# Altium schematic symbol library Electronic Devices_LIB.SchLib: 703 symbols (part 6 of 8) (continued)
## IND_4.7uH_1.01A_1210_CBC3225T4R7MR
designator L?, comment Case Code (Imperial): 1210  Max DC Current: 1.01A  Inductance: 4.7uH  (hidden comment: CBC3225T4R7MR)
Inductor Power Chip Wirewound 4.7uH 20% 100KHz Ferrite 1.01A 0.13Ohm DCR 1210 T/R; Manufacturer: Taiyo Yuden; Self Resonant Frequency: 70MHz; Saturation Current: 1.25A; Shielding: Unshielded; Resistance: 0.1R; DC Resistance (DCR): 130mR; Supplier 1: Digikey; Manufacturer Part Number: CBC3225T4R7MR; RoHS: Yes; Category: Fixed Inductors; Stock 1: 865462; Pricing 1: 1=0.25, 10=0.192, 25=0.1732, 50=0.1606, 100=0.1488, 250=0.13456, 500=0.12468, 1000=0.11549, 2000=0.10696, 3000=0.10226, 5000=0.09661, 7000=0.09305, 10000=0.08942, 25000=0.08068, 50000=0.07625 (USD); Mount: Surface Mount; Case/Package: 1210; Number of Pins: 2; Core Material: Ferrite; Case Code (Metric): 3225; Min Operating Temperature: -40°C; Max Operating Temperature: 105°C; Tolerance: 20%; Packaging: Tape and Reel; Package Quantity: 1000; Termination: SMD/SMT; Test Frequency: 100kHz; Current Rating: 1.01A; Series: CB; Inductance Tolerance: 20%; DC Current: 1.01A; Inductor Type: POWER; RMS Current (Irms): 1.01A; Series Resistance: 130mR; Length: 0.126inch; Width: 0.098inch; Height: 2.5mm; Height - Seated (Max): 0.106inch; Depth: 2.7mm; Radiation Hardening: No; RoHS Compliant: Yes; Military Standard: Not; Lead Free: Lead Free; Halogen Free: Halogen Free; Reach SVHC Compliant: Unknown; ComponentLink1URL: https://datasheet.ciiva.com/8505/wound02-e-8505619.pdf?src-supplier=Avnet; ComponentLink1Description: https://datasheet.ciiva.com/8505/wound02-e-8505619.pdf?src-supplier=Avnet; ComponentLink2URL: https://datasheet.ciiva.com/15981/787cbc3225t4r7mr-15981712.pdf?src-supplier=Onlinecomponents.com; ComponentLink2Description: https://datasheet.ciiva.com/15981/787cbc3225t4r7mr-15981712.pdf?src-supplier=Onlinecomponents.com; ComponentLink3URL: https://datasheet.ciiva.com/26871/getdatasheetpartid-638538-26871185.pdf?src-supplier=Verical; ComponentLink3Description: https://datasheet.ciiva.com/26871/getdatasheetpartid-638538-26871185.pdf?src-supplier=Verical; ComponentLink4URL: https://datasheet.ciiva.com/7291/cbc3225t4r7mr-ss-7291523.pdf?src-supplier=Newark; ComponentLink4Description: https://datasheet.ciiva.com/7291/cbc3225t4r7mr-ss-7291523.pdf?src-supplier=Newark; ComponentLink5URL: https://datasheet.ciiva.com/8001/1521599-8001884.pdf?src-supplier=Element14; ComponentLink5Description: https://datasheet.ciiva.com/8001/1521599-8001884.pdf?src-supplier=Element14; Supplier Part Number 1: 587-1624-1-ND
footprint IND_1210_NDC3225X270N
pins: 1, 2

## IND_4.7uH_2.9A_74438356047
designator L?, comment 74438356047  Current Rating: 2.9A  Inductance: 4.7uH
WE-MAPI; Shielded Wire-wound SMD Inductor with Magnetic Iron Alloy Core; 4.7 µH; Manufacturer: Wurth Electronics; Core Material: Metal,Composite; DC Resistance (DCR): 76mR; Self Resonant Frequency: 22MHz; Test Frequency: 100kHz; Tolerance: 20%; Saturation Current: 4.7A; Supplier 1: Digi-Key; Manufacturer Part Number: 74438356047; RoHS: Yes; Category: Fixed Inductors; Stock 1: 1624; Pricing 1: 1=1.94, 10=1.898, 50=1.815, 100=1.672, 500=1.541 (USD); Mount: Surface Mount; Case/Package: SMD/SMT; Number of Pins: 2; Min Operating Temperature: -40°C; Max Operating Temperature: 125°C; Shielding: Shielded; Series: WE-MAPI; Packaging: Cut Tape; Length: 0.161inch; Width: 0.161inch; Height - Seated (Max): 0.083inch; RoHS Compliant: Yes; ComponentLink1URL: http://www.farnell.com/datasheets/2618709.pdf?src-supplier=Farnell; ComponentLink1Description: http://www.farnell.com/datasheets/2618709.pdf?src-supplier=Farnell; ComponentLink2URL: http://www.farnell.com/datasheets/2618709.pdf?src-supplier=Element14; ComponentLink2Description: http://www.farnell.com/datasheets/2618709.pdf?src-supplier=Element14; ComponentLink3URL: http://www.farnell.com/datasheets/2618709.pdf?src-supplier=Newark; ComponentLink3Description: http://www.farnell.com/datasheets/2618709.pdf?src-supplier=Newark; ComponentLink4URL: https://katalog.we-online.de/pbs/datasheet/74438356047.pdf?src-supplier=Digi-Key; ComponentLink4Description: https://katalog.we-online.de/pbs/datasheet/74438356047.pdf?src-supplier=Digi-Key; Supplier Part Number 1: 732-8234-1-ND
footprint IND_74438356047 (0.161" L x 0.161" W (4.10mm x 4.10mm))
pins: 1, 2

## IND_4.7uH_5.8A_SMD
designator L?, comment SRN8040TA-4R7M  Inductance: 4.7uH  RMS Current (Irms): 5.8A
Inductor Power Semi-Shielded Wirewound 4.7uH 20% 1MHz 15Q-Factor Ferrite 5.8A 0.0195Ohm DCR 3131 Automotive T/R; Manufacturer: Bourns; Saturation Current: 6.7A; DC Resistance (DCR): 19.5mR; Self Resonant Frequency: 38MHz; Supplier 1: Digi-Key; Manufacturer Part Number: SRN8040TA-4R7M; RoHS: Yes; Category: Fixed Inductors; Stock 1: 51554; Pricing 1: 1=0.73, 10=0.674, 25=0.5704, 50=0.5186, 100=0.4875, 250=0.43564, 500=0.37342 (USD); Mount: Surface Mount; Case/Package: Nonstandard; Core Material: Ferrite; Min Operating Temperature: -55°C; Max Operating Temperature: 125°C; Packaging: Cut Tape; Inductance Tolerance: 20%; Series: SRN8040TA; Tolerance: 20%; Shielding: Shielded; Test Frequency: 1MHz; Ratings: AEC-Q200; Reach SVHC Compliant: No; RoHS Compliant: Yes; ComponentLink1URL: http://www.farnell.com/datasheets/2647424.pdf?src-supplier=Farnell; ComponentLink1Description: http://www.farnell.com/datasheets/2647424.pdf?src-supplier=Farnell; ComponentLink2URL: https://www.bourns.com/docs/Product-Datasheets/SRN8040TA.pdf?src-supplier=Digi-Key; ComponentLink2Description: https://www.bourns.com/docs/Product-Datasheets/SRN8040TA.pdf?src-supplier=Digi-Key; ComponentLink3URL: http://www.farnell.com/datasheets/2113224.pdf?src-supplier=Element14; ComponentLink3Description: http://www.farnell.com/datasheets/2113224.pdf?src-supplier=Element14; ComponentLink4URL: http://www.farnell.com/datasheets/2647424.pdf?src-supplier=Newark; ComponentLink4Description: http://www.farnell.com/datasheets/2647424.pdf?src-supplier=Newark; ComponentLink5URL: https://datasheet.octopart.com/SRN8040TA-4R7M-Bourns-datasheet-66075752.pdf?src-supplier=Newark; ComponentLink5Description: https://datasheet.octopart.com/SRN8040TA-4R7M-Bourns-datasheet-66075752.pdf?src-supplier=Newark; ComponentLink6URL: https://datasheet.octopart.com/SRN8040TA-4R7M-Bourns-datasheet-154729938.pdf?src-supplier=Electro+Sonic; ComponentLink6Description: https://datasheet.octopart.com/SRN8040TA-4R7M-Bourns-datasheet-154729938.pdf?src-supplier=Electro+Sonic; Supplier Part Number 1: SRN8040TA-4R7MCT-ND
footprint IND_INDPM8080X450N (0.315" L x 0.315" W (8.00mm x 8.00mm))
pins: 1, 2

## IND_6.8uH_870mA_XPL2010-682MLC
designator L?, comment Max DC Current: 870mA  Inductance: 6.8uH  (hidden comment: XPL2010-682MLC)
Power inductor, shielded, 20% tol, SMT, RoHS; Manufacturer: Coilcraft; Core Material: Composite; Self Resonant Frequency: 33MHz; Test Frequency: 100kHz; Supplier 1: Mouser; Manufacturer Part Number: XPL2010-682MLC; RoHS: Yes; Category: Fixed Inductors; Stock 1: 16811; Pricing 1: 1=2.46, 10=2.46, 50=2.46, 100=2.46, 250=1.73, 500=1.2, 1000=1.12, 2000=1.12, 10000=1.12 (USD); Min Operating Temperature: -40°C; Max Operating Temperature: 85°C; Packaging: Tape and Reel; Package Quantity: 2000; Tolerance: 20%; Shielding: Shielded; Termination: SMD/SMT; Series: XPL2010; Length: 2.2mm; Width: 2.1mm; Height: 1mm; Lead Free: Contains Lead; RoHS Compliant: Yes; ComponentLink1URL: http://www.mouser.com/ds/2/597/xpl2010-270692.pdf?src-supplier=Mouser; ComponentLink1Description: http://www.mouser.com/ds/2/597/xpl2010-270692.pdf?src-supplier=Mouser; Supplier Part Number 1: 994-XPL2010-682MLC
footprint IND_AUTOMOTIVE_XPL2010682MLC
pins: 1, 2

## IND_15NF_300MA_0603
designator L?, comment Case Code (Imperial): 0603  Max DC Current: 300mA  Inductance: 15nH  (hidden comment: AIMC-0603-15NJ-T)
Inductor RF Multi-Layer 0.015uH 5% 100MHz 12Q-Factor Ceramic 0.3A 0.32Ohm DCR 0603 T/R; Manufacturer: Abracon; Shielding: Unshielded; Self Resonant Frequency: 2.5GHz; DC Resistance (DCR): 320mR; Q Factor: 12; Supplier 1: Digi-Key; Manufacturer Part Number: AIMC-0603-15NJ-T; RoHS: Yes; Category: Fixed Inductors; Stock 1: 56097; Pricing 1: 1=0.1, 10=0.073, 25=0.0652, 50=0.0554, 100=0.0489, 250=0.04484, 500=0.04076, 1000=0.03423 (USD); Mount: Surface Mount; Case/Package: 0603; Case Code (Metric): 1608; Core Material: Ceramic; Min Operating Temperature: -55°C; Max Operating Temperature: 125°C; Current Rating: 300mA; Tolerance: 5%; Packaging: Tape and Reel; Test Frequency: 100MHz; Termination: SMD/SMT; Series: AIMC-0603; Package Quantity: 4000; Length: 0.063inch; Width: 0.031inch; Height: 0.8mm; Height - Seated (Max): 0.039inch; RoHS Compliant: Yes; ComponentLink1URL: https://datasheet.ciiva.com/1053/aimc-0603-1053361.pdf?src-supplier=Digi-Key; ComponentLink1Description: https://datasheet.ciiva.com/1053/aimc-0603-1053361.pdf?src-supplier=Digi-Key; ComponentLink2URL: https://datasheet.ciiva.com/1053/aimc-0603-1053362.pdf?src-supplier=Digi-Key; ComponentLink2Description: https://datasheet.ciiva.com/1053/aimc-0603-1053362.pdf?src-supplier=Digi-Key; ComponentLink3URL: https://datasheet.ciiva.com/1053/aimc-0603-1053363.pdf?src-supplier=Digi-Key; ComponentLink3Description: https://datasheet.ciiva.com/1053/aimc-0603-1053363.pdf?src-supplier=Digi-Key; Supplier Part Number 1: 535-11527-1-ND
footprint IND_0603_INDC1608X08N (Chip Inductor, 2-Leads, Body 1.60x0.80mm, IPC Medium Density)
pins: 1, 2

## IND_22NH_500MA_0603
designator L?, comment Inductance: 22nH  Current Rating: 500mA  Case Code (Imperial): 0603  (hidden comment: LQW18AN22NG00D)
Inductor RF Chip Wirewound 22nH 2% 100MHz 40Q-Factor 500mA 170mOhm DCR 0603 Paper T/R; Manufacturer: Murata; Core Material: Non-Magnetic; Self Resonant Frequency: 4.6GHz; Shielding: Unshielded; Q Factor: 40; DC Resistance (DCR): 170mR; Current: 400mA; Supplier 1: Digi-Key; Manufacturer Part Number: LQW18AN22NG00D; RoHS: Yes; Category: Fixed Inductors; Stock 1: 90663; Pricing 1: 1=0.17, 10=0.155, 25=0.1372, 50=0.1168, 100=0.103, 250=0.09444, 500=0.08584, 1000=0.07211 (USD); Mount: Surface Mount; Case/Package: 0603; Number of Pins: 2; Weight: 0.000106oz; Case Code (Metric): 1608; Min Operating Temperature: -55°C; Max Operating Temperature: 125°C; Tolerance: 2%; Inductance Tolerance: 2%; Packaging: Tape and Reel; Package Quantity: 1; Max DC Current: 500mA; Termination: SMD/SMT; Test Frequency: 100MHz; DC Current: 500mA; Series Resistance: 170mR; Series: LQW18A_00; Rated Current-Max: 500mA; Length: 1.6mm; Width: 0.8mm; Height: 0.8mm; Height - Seated (Max): 0.039inch; Depth: 1mm; Reach SVHC Compliant: No; Military Standard: Not; Lead Free: Lead Free; RoHS Compliant: Yes; ComponentLink1URL: https://datasheet.ciiva.com/11799/0900766b80a002db-11799279.pdf?src-supplier=Rs; ComponentLink1Description: https://datasheet.ciiva.com/11799/0900766b80a002db-11799279.pdf?src-supplier=Rs; ComponentLink2URL: https://datasheet.ciiva.com/4977/product-4977173.pdf?src-supplier=Mouser; ComponentLink2Description: https://datasheet.ciiva.com/4977/product-4977173.pdf?src-supplier=Mouser; ComponentLink3URL: https://datasheet.ciiva.com/8507/l0075s0080lqw18a-00-8507496.pdf?src-supplier=Avnet; ComponentLink3Description: https://datasheet.ciiva.com/8507/l0075s0080lqw18a-00-8507496.pdf?src-supplier=Avnet; ComponentLink4URL: https://datasheet.ciiva.com/6705/l0075s0080lqw18a-00-6705626.pdf?src-supplier=Digi-Key; ComponentLink4Description: https://datasheet.ciiva.com/6705/l0075s0080lqw18a-00-6705626.pdf?src-supplier=Digi-Key; ComponentLink5URL: https://datasheet.ciiva.com/6705/l0075s0080lqw18a-00-6705627.pdf?src-supplier=Digi-Key; ComponentLink5Description: https://datasheet.ciiva.com/6705/l0075s0080lqw18a-00-6705627.pdf?src-supplier=Digi-Key; ComponentLink6URL: https://datasheet.ciiva.com/6705/l0075s0080lqw18a-00-6705631.pdf?src-supplier=Digi-Key; ComponentLink6Description: https://datasheet.ciiva.com/6705/l0075s0080lqw18a-00-6705631.pdf?src-supplier=Digi-Key; ComponentLink7URL: https://datasheet.ciiva.com/14124/qhlqw18a-data-e-14124619.pdf?src-supplier=Distrelec; ComponentLink7Description: https://datasheet.ciiva.com/14124/qhlqw18a-data-e-14124619.pdf?src-supplier=Distrelec; ComponentLink8URL: https://datasheet.ciiva.com/46391/1487239-46391853.pdf?src-supplier=Element14; ComponentLink8Description: https://datasheet.ciiva.com/46391/1487239-46391853.pdf?src-supplier=Element14; Supplier Part Number 1: 490-6874-6-ND
footprint IND_0603_INDC1608X08N (Chip Inductor, 2-Leads, Body 1.60x0.80mm, IPC Medium Density)
pins: 1, 2

## IND_22UH_50MA_0603
designator L?, comment Inductance: 22uH  Max DC Current: 50mA  Case Code (Imperial): 0603  (hidden comment: LBMF1608T220K)
Inductor General Purpose Chip Wirewound 22uH 10% 2.52MHz Ferrite 0.05A 1.3Ohm DCR 0603 T/R; Manufacturer: Taiyo Yuden; Self Resonant Frequency: 16MHz; Shielding: Unshielded; DC Resistance (DCR): 1R; Supplier 1: Digi-Key; Manufacturer Part Number: LBMF1608T220K; RoHS: Yes; Category: Fixed Inductors; Stock 1: 12714; Pricing 1: 1=0.23, 10=0.205, 25=0.1816, 50=0.1546, 100=0.1364, 250=0.125, 500=0.11362, 1000=0.09544 (USD); Mount: Surface Mount; Case/Package: 0603; Core Material: Ferrite; Case Code (Metric): 1608; Weight: 7.1E-05oz; Min Operating Temperature: -40°C; Max Operating Temperature: 105°C; Packaging: Tape and Reel; Tolerance: 10%; Test Frequency: 2.52MHz; Termination: SMD/SMT; Package Quantity: 1; DC Current: 50mA; Series: LB; Inductance Tolerance: 10%; Length: 0.063inch; Width: 0.031inch; Height: 0.35mm; Depth: 0.9mm; Height - Seated (Max): 0.039inch; Lead Pitch: 0.7mm; Radiation Hardening: No; Lead Free: Lead Free; Halogen Free: Halogen Free; Military Standard: Not; RoHS Compliant: Yes; Reach SVHC Compliant: Unknown; ComponentLink1URL: https://datasheet.ciiva.com/8504/lbmf1608t220k-ss-8504749.pdf?src-supplier=Avnet; ComponentLink1Description: https://datasheet.ciiva.com/8504/lbmf1608t220k-ss-8504749.pdf?src-supplier=Avnet; ComponentLink2URL: https://datasheet.ciiva.com/1040/lbmf1608t220k-ss-1040368.pdf?src-supplier=Digi-Key; ComponentLink2Description: https://datasheet.ciiva.com/1040/lbmf1608t220k-ss-1040368.pdf?src-supplier=Digi-Key; ComponentLink3URL: https://datasheet.ciiva.com/26872/getdatasheetpartid-638611-26872443.pdf?src-supplier=Verical; ComponentLink3Description: https://datasheet.ciiva.com/26872/getdatasheetpartid-638611-26872443.pdf?src-supplier=Verical; Supplier Part Number 1: 587-1715-1-ND; Current Rating: 50mA
footprint IND_0603_INDC1608X08N (Chip Inductor, 2-Leads, Body 1.60x0.80mm, IPC Medium Density)
pins: 1, 2

## IND_27NH_590MA_0603
designator L?, comment Max DC Current: 590mA  Inductance: 27nH  Case/Package: 0603  (hidden comment: LQW18AN27NG10D)
Inductor RF Chip Wirewound 27nH 2% 100MHz 42Q-Factor 590mA 116mOhm DCR 0603 Paper T/R; Manufacturer: Murata; Core Material: Non-Magnetic; DC Resistance (DCR): 116mR; Shielding: Unshielded; Self Resonant Frequency: 2.8GHz; Q Factor: 42; Supplier 1: Digi-Key; Manufacturer Part Number: LQW18AN27NG10D; RoHS: Yes; Category: Fixed Inductors; Stock 1: 9248; Pricing 1: 1=0.19, 10=0.173, 25=0.1536, 50=0.1304, 100=0.1151, 250=0.10556, 500=0.09596, 1000=0.0806 (USD); Mount: Surface Mount; Weight: 0.000106oz; Case Code (Metric): 1608; Case Code (Imperial): 0603; Min Operating Temperature: -55°C; Max Operating Temperature: 125°C; Tolerance: 2%; Packaging: Tape and Reel; Series: LQW18A_10; Inductance Tolerance: 2%; Package Quantity: 1; Current Rating: 590mA; Test Frequency: 100MHz; Termination: SMD/SMT; DC Current: 590mA; Length: 1.6mm; Width: 0.031inch; Height: 0.8mm; Depth: 1.1mm; Height - Seated (Max): 0.039inch; Radiation Hardening: No; Lead Free: Lead Free; Military Standard: Not; Reach SVHC Compliant: No; RoHS Compliant: Yes; ComponentLink1URL: https://datasheet.ciiva.com/11799/0900766b80a002db-11799175.pdf?src-supplier=Rs; ComponentLink1Description: https://datasheet.ciiva.com/11799/0900766b80a002db-11799175.pdf?src-supplier=Rs; ComponentLink2URL: https://datasheet.ciiva.com/8507/l0075s0080lqw18a-10-8507510.pdf?src-supplier=Avnet; ComponentLink2Description: https://datasheet.ciiva.com/8507/l0075s0080lqw18a-10-8507510.pdf?src-supplier=Avnet; ComponentLink3URL: https://datasheet.ciiva.com/6705/l0075s0080lqw18a-10-6705574.pdf?src-supplier=Digi-Key; ComponentLink3Description: https://datasheet.ciiva.com/6705/l0075s0080lqw18a-10-6705574.pdf?src-supplier=Digi-Key; ComponentLink4URL: https://datasheet.ciiva.com/4978/product-4978252.pdf?src-supplier=Mouser; ComponentLink4Description: https://datasheet.ciiva.com/4978/product-4978252.pdf?src-supplier=Mouser; Supplier Part Number 1: 490-6880-1-ND
footprint IND_0603_INDC1608X08N (Chip Inductor, 2-Leads, Body 1.60x0.80mm, IPC Medium Density)
pins: 1, 2

## IND_33NH_550MA_0603
designator L?, comment Max DC Current: 550mA  Inductance: 33nH  Case/Package: 0603  (hidden comment: LQW18AN33NJ10D)
Inductor RF Chip Wirewound 33nH 5% 100MHz 42Q-Factor 550mA 132mOhm DCR 0603 Paper T/R; Manufacturer: Murata; Core Material: Non-Magnetic,Air; Self Resonant Frequency: 2.5GHz; Shielding: Unshielded; Q Factor: 42; DC Resistance (DCR): 132mR; Current: 1.2A; Supplier 1: Digi-Key; Manufacturer Part Number: LQW18AN33NJ10D; RoHS: Yes; Category: Fixed Inductors; Stock 1: 76733; Pricing 1: 1=0.18, 10=0.164, 25=0.1456, 50=0.1236, 100=0.1091, 250=0.1, 500=0.0909, 1000=0.07636 (USD); Mount: Surface Mount; Weight: 0.000106oz; Case Code (Metric): 1608; Case Code (Imperial): 0603; Min Operating Temperature: -55°C; Max Operating Temperature: 125°C; Package Quantity: 1; Packaging: Tape and Reel; Tolerance: 5%; Termination: SMD/SMT; Test Frequency: 100MHz; DC Current: 550mA; Series: LQW18A_10; Length: 1.6mm; Width: 0.8mm; Height: 0.8mm; Depth: 1.1mm; Radiation Hardening: No; Military Standard: Not; Lead Free: Lead Free; RoHS Compliant: Yes; ComponentLink1URL: https://datasheet.ciiva.com/11801/0900766b80a002db-11801478.pdf?src-supplier=Rs; ComponentLink1Description: https://datasheet.ciiva.com/11801/0900766b80a002db-11801478.pdf?src-supplier=Rs; ComponentLink2URL: https://datasheet.ciiva.com/6709/l0075s0080lqw18a-10-6709851.pdf?src-supplier=Digi-Key; ComponentLink2Description: https://datasheet.ciiva.com/6709/l0075s0080lqw18a-10-6709851.pdf?src-supplier=Digi-Key; ComponentLink3URL: https://datasheet.ciiva.com/6709/l0075s0080lqw18a-10-6709854.pdf?src-supplier=Digi-Key; ComponentLink3Description: https://datasheet.ciiva.com/6709/l0075s0080lqw18a-10-6709854.pdf?src-supplier=Digi-Key; Supplier Part Number 1: 490-6885-1-ND
footprint IND_0603_INDC1608X08N (Chip Inductor, 2-Leads, Body 1.60x0.80mm, IPC Medium Density)
pins: 1, 2

## IND_33uH_1.2A_NR5040T330M
designator L?, comment NR5040T330M  Inductance: 33uH  Current Rating: 1.2A
Inductor Power Shielded Wirewound 33uH 20% 100KHz Ferrite 1.2A 0.234Ohm DCR T/R; Manufacturer: Taiyo Yuden; Self Resonant Frequency: 7MHz; DC Resistance (DCR): 234mR; Max DC Current: 1.3A; Supplier 1: Mouser; Manufacturer Part Number: NR5040T330M; RoHS: Yes; Category: Fixed Inductors; Stock 1: 22851; Pricing 1: 1=0.3, 10=0.262, 50=0.262, 100=0.187, 1000=0.143, 10000=0.137 (USD); Mount: Surface Mount; Case/Package: Nonstandard; Number of Pins: 2; Core Material: Ferrite; Min Operating Temperature: -25°C; Max Operating Temperature: 120°C; Package Quantity: 1500; Tolerance: 20%; Shielding: Shielded; Packaging: Tape and Reel; Test Frequency: 100kHz; Termination: SMD/SMT; Series: NR; Saturation Current: 1.3A; Length: 0.193inch; Width: 0.193inch; Height: 4mm; Height - Seated (Max): 0.157inch; Depth: 5.1mm; Radiation Hardening: No; RoHS Compliant: Yes; Halogen Free: Halogen Free; ComponentLink1URL: https://datasheet.ciiva.com/8502/nr5040t330m-ss-8502902.pdf?src-supplier=Avnet; ComponentLink1Description: https://datasheet.ciiva.com/8502/nr5040t330m-ss-8502902.pdf?src-supplier=Avnet; ComponentLink2URL: https://datasheet.ciiva.com/6689/wound04-e-6689243.pdf?src-supplier=Digi-Key; ComponentLink2Description: https://datasheet.ciiva.com/6689/wound04-e-6689243.pdf?src-supplier=Digi-Key; ComponentLink3URL: https://datasheet.ciiva.com/6689/wound04-e-6689278.pdf?src-supplier=Digi-Key; ComponentLink3Description: https://datasheet.ciiva.com/6689/wound04-e-6689278.pdf?src-supplier=Digi-Key; ComponentLink4URL: https://datasheet.ciiva.com/4963/wound04-e-4963276.pdf?src-supplier=Mouser; ComponentLink4Description: https://datasheet.ciiva.com/4963/wound04-e-4963276.pdf?src-supplier=Mouser; Supplier Part Number 1: 963-NR5040T330M
footprint IND_NR5040T330M (0.193" L x 0.193" W (4.90mm x 4.90mm))
pins: 1, 2

## IND_33uH_1.2A_SDR0805-330KL
designator L?, comment SDR0805-330KL  Current Rating: 1.2A  Inductance: 33uH
Inductor Power Wirewound 33uH 10% 1KHz 15Q-Factor Ferrite 1.2A 140mOhm DCR T/R; Manufacturer: Bourns; Saturation Current: 1.9A; Shielding: Unshielded; Q Factor: 15; Self Resonant Frequency: 10MHz; Resistance: 140MR; Supplier 1: Mouser; Manufacturer Part Number: SDR0805-330KL; RoHS: Yes; Category: Fixed Inductors; Stock 1: 4570; Pricing 1: 1=0.68, 10=0.483, 50=0.483, 100=0.406, 1000=0.249, 10000=0.233 (USD); Mount: Surface Mount; Case/Package: Nonstandard; Number of Pins: 2; Core Material: Ferrite; Case Code (Metric): 2012; Case Code (Imperial): 0805; Min Operating Temperature: -40°C; Max Operating Temperature: 125°C; Package Quantity: 1; Tolerance: 10%; Packaging: Tape and Reel; Inductance Tolerance: 10%; DC Resistance (DCR): 140mR; Test Frequency: 1kHz; Max DC Current: 1.2A; Termination: SMD/SMT; RMS Current (Irms): 1.2A; Series: SDR0805; Sample Rate (Hz): 1kHz; Diameter: 7.8mm; Length: 0.307inch; Width: 5.3mm; Height: 5.3mm; Height - Seated (Max): 0.209inch; Radiation Hardening: No; Reach SVHC Compliant: No; RoHS Compliant: Yes; ComponentLink1URL: https://datasheet.ciiva.com/1049/sdr0805-1049424.pdf?src-supplier=Digi-Key; ComponentLink1Description: https://datasheet.ciiva.com/1049/sdr0805-1049424.pdf?src-supplier=Digi-Key; ComponentLink2URL: https://datasheet.ciiva.com/8517/sdr0805-8517560.pdf?src-supplier=Avnet; ComponentLink2Description: https://datasheet.ciiva.com/8517/sdr0805-8517560.pdf?src-supplier=Avnet; ComponentLink3URL: https://datasheet.ciiva.com/8517/sdr0805-8517564.pdf?src-supplier=Avnet; ComponentLink3Description: https://datasheet.ciiva.com/8517/sdr0805-8517564.pdf?src-supplier=Avnet; ComponentLink4URL: https://datasheet.ciiva.com/29698/sdr0805-29698618.pdf?src-supplier=Digi-Key; ComponentLink4Description: https://datasheet.ciiva.com/29698/sdr0805-29698618.pdf?src-supplier=Digi-Key; ComponentLink5URL: https://datasheet.ciiva.com/30177/sdr0805-30177849.pdf?src-supplier=Onlinecomponents.com; ComponentLink5Description: https://datasheet.ciiva.com/30177/sdr0805-30177849.pdf?src-supplier=Onlinecomponents.com; ComponentLink6URL: https://datasheet.ciiva.com/17112/70153514-17112629.pdf?src-supplier=Allied+Electronics; ComponentLink6Description: https://datasheet.ciiva.com/17112/70153514-17112629.pdf?src-supplier=Allied+Electronics; ComponentLink7URL: https://datasheet.ciiva.com/1049/sdr0805-1049423.pdf?src-supplier=Digi-Key; ComponentLink7Description: https://datasheet.ciiva.com/1049/sdr0805-1049423.pdf?src-supplier=Digi-Key; ComponentLink8URL: https://datasheet.ciiva.com/7838/1695378-7838934.pdf?src-supplier=Element14; ComponentLink8Description: https://datasheet.ciiva.com/7838/1695378-7838934.pdf?src-supplier=Element14; Supplier Part Number 1: 652-SDR0805-330KL
footprint IND_SDR0805330KL (0.307" L x 0.307" W (7.80mm x 7.80mm))
pins: 1, 2

## IND_100NH_300mA_0603
designator L?, comment Case Code (Imperial): 0603  Inductance: 100nH  Current Rating: 300mA  (hidden comment: LQG18HNR10J00D)
Inductor RF Chip Multi-Layer 100nH 5% 100MHz 12Q-Factor Air 300mA 900mOhm DCR 0603 Paper T/R; Manufacturer: Murata; DC Resistance (DCR): 900mR; Shielding: Unshielded; Self Resonant Frequency: 800MHz; Q Factor: 12; Supplier 1: Digi-Key; Manufacturer Part Number: LQG18HNR10J00D; RoHS: Yes; Category: Fixed Inductors; Stock 1: 316408; Pricing 1: 1=0.24, 10=0.214, 25=0.1872, 50=0.1606, 100=0.1472, 250=0.13384, 500=0.1258, 1000=0.09635 (USD); Mount: Surface Mount; Case/Package: 0603; Number of Pins: 2; Core Material: Air; Case Code (Metric): 1608; Min Operating Temperature: -40°C; Max Operating Temperature: 85°C; Tolerance: 5%; Packaging: Tape and Reel; Max DC Current: 300mA; Series: LQG18H; Package Quantity: 1; Inductance Tolerance: 5%; Test Frequency: 100MHz; Termination: SMD/SMT; DC Current: 300mA; Rated Current-Max: 300mA; Length: 1.75mm; Width: 0.031inch; Height: 0.031inch; Depth: 0.95mm; Radiation Hardening: No; Reach SVHC Compliant: No; Lead Free: Lead Free; Military Standard: Not; RoHS Compliant: Yes; ComponentLink1URL: https://datasheet.ciiva.com/11801/0900766b80f1087c-11801431.pdf?src-supplier=Rs; ComponentLink1Description: https://datasheet.ciiva.com/11801/0900766b80f1087c-11801431.pdf?src-supplier=Rs; ComponentLink2URL: https://datasheet.ciiva.com/6710/l0075s0083lqg18h-6710060.pdf?src-supplier=Digi-Key; ComponentLink2Description: https://datasheet.ciiva.com/6710/l0075s0083lqg18h-6710060.pdf?src-supplier=Digi-Key; ComponentLink3URL: https://datasheet.ciiva.com/6710/l0075s0083lqg18h-6710062.pdf?src-supplier=Digi-Key; ComponentLink3Description: https://datasheet.ciiva.com/6710/l0075s0083lqg18h-6710062.pdf?src-supplier=Digi-Key; ComponentLink4URL: https://datasheet.ciiva.com/8002/5102-8002605.pdf?src-supplier=Element14; ComponentLink4Description: https://datasheet.ciiva.com/8002/5102-8002605.pdf?src-supplier=Element14; ComponentLink5URL: https://datasheet.ciiva.com/8002/5102-8002606.pdf?src-supplier=Element14; ComponentLink5Description: https://datasheet.ciiva.com/8002/5102-8002606.pdf?src-supplier=Element14; Supplier Part Number 1: 490-6586-6-ND
footprint IND_0603_INDC1608X08N (Chip Inductor, 2-Leads, Body 1.60x0.80mm, IPC Medium Density)
pins: 1, 2

## IND_100uH_340mA_1210_CBC3225T101MR
designator L?, comment Max DC Current: 340mA  Inductance: 100uH  Case Code (Imperial): 1210  (hidden comment: CBC3225T101MR)
Inductor Power Chip Wirewound 100uH 20% 100KHz Ferrite 0.34A 1.82Ohm DCR 1210 T/R; Manufacturer: Taiyo Yuden; Self Resonant Frequency: 6MHz; Saturation Current: 270mA; Shielding: Unshielded; DC Resistance (DCR): 1.82R; Resistance: 1.4R; Supplier 1: Digikey; Manufacturer Part Number: CBC3225T101MR; RoHS: Yes; Category: Fixed Inductors; Stock 1: 125021; Pricing 1: 1=0.25, 10=0.192, 25=0.1732, 50=0.1606, 100=0.1488, 250=0.13456, 500=0.12468 (USD); Mount: Surface Mount; Case/Package: 1210; Number of Pins: 2; Core Material: Ferrite; Case Code (Metric): 3225; Min Operating Temperature: -40°C; Max Operating Temperature: 105°C; Tolerance: 20%; Packaging: Tape and Reel; Test Frequency: 100kHz; Termination: SMD/SMT; Series: CB; Inductance Tolerance: 20%; Package Quantity: 1000; Current Rating: 340mA; DC Current: 340mA; Inductor Type: POWER; Length: 0.126inch; Width: 0.098inch; Height: 2.5mm; Depth: 2.7mm; Height - Seated (Max): 0.106inch; Radiation Hardening: No; RoHS Compliant: Yes; Military Standard: Not; Lead Free: Lead Free; Halogen Free: Halogen Free; Reach SVHC Compliant: Unknown; ComponentLink1URL: https://datasheet.ciiva.com/15981/520cbc3225t101mr-15981701.pdf?src-supplier=Onlinecomponents.com; ComponentLink1Description: https://datasheet.ciiva.com/15981/520cbc3225t101mr-15981701.pdf?src-supplier=Onlinecomponents.com; ComponentLink2URL: https://datasheet.ciiva.com/8001/cbc3225t101mr-ss-8001894.pdf?src-supplier=Element14; ComponentLink2Description: https://datasheet.ciiva.com/8001/cbc3225t101mr-ss-8001894.pdf?src-supplier=Element14; ComponentLink3URL: https://datasheet.ciiva.com/26871/getdatasheetpartid-638535-26871174.pdf?src-supplier=Verical; ComponentLink3Description: https://datasheet.ciiva.com/26871/getdatasheetpartid-638535-26871174.pdf?src-supplier=Verical; Supplier Part Number 1: 587-1628-1-ND
footprint IND_1210_NDC3225X270N
pins: 1, 2

## IND_220NH_300MA_0603
designator L?, comment Current Rating: 300mA  Inductance: 220nH  Case/Package: 0603  (hidden comment: LQG18HHR22J00D)
Inductor RF Chip Multi-Layer 0.22uH 5% 100MHz 14Q-Factor Air 0.3A 1.5Ohm DCR 0603 Automotive T/R; Manufacturer: Murata; DC Resistance (DCR): 1.5R; Self Resonant Frequency: 450MHz; Supplier 1: Digi-Key; Manufacturer Part Number: LQG18HHR22J00D; RoHS: Yes; Category: Fixed Inductors; Stock 1: 2300; Pricing 1: 1=0.3, 10=0.266, 25=0.2328, 50=0.1994, 100=0.1828, 250=0.16616, 500=0.15618, 1000=0.11962 (USD); Mount: Surface Mount; Case Code (Imperial): 0603; Core Material: Air; Min Operating Temperature: -55°C; Max Operating Temperature: 125°C; Package Quantity: 4000; Packaging: Tape and Reel; Termination: SMD/SMT; Series: LQG18; Tolerance: 5%; Test Frequency: 100MHz; RoHS Compliant: Yes; ComponentLink1URL: https://datasheet.ciiva.com/4981/o05e-4981686.pdf?src-supplier=Mouser; ComponentLink1Description: https://datasheet.ciiva.com/4981/o05e-4981686.pdf?src-supplier=Mouser; Supplier Part Number 1: 490-17882-1-ND
footprint IND_0603_INDC1608X08N (Chip Inductor, 2-Leads, Body 1.60x0.80mm, IPC Medium Density)
pins: 1, 2

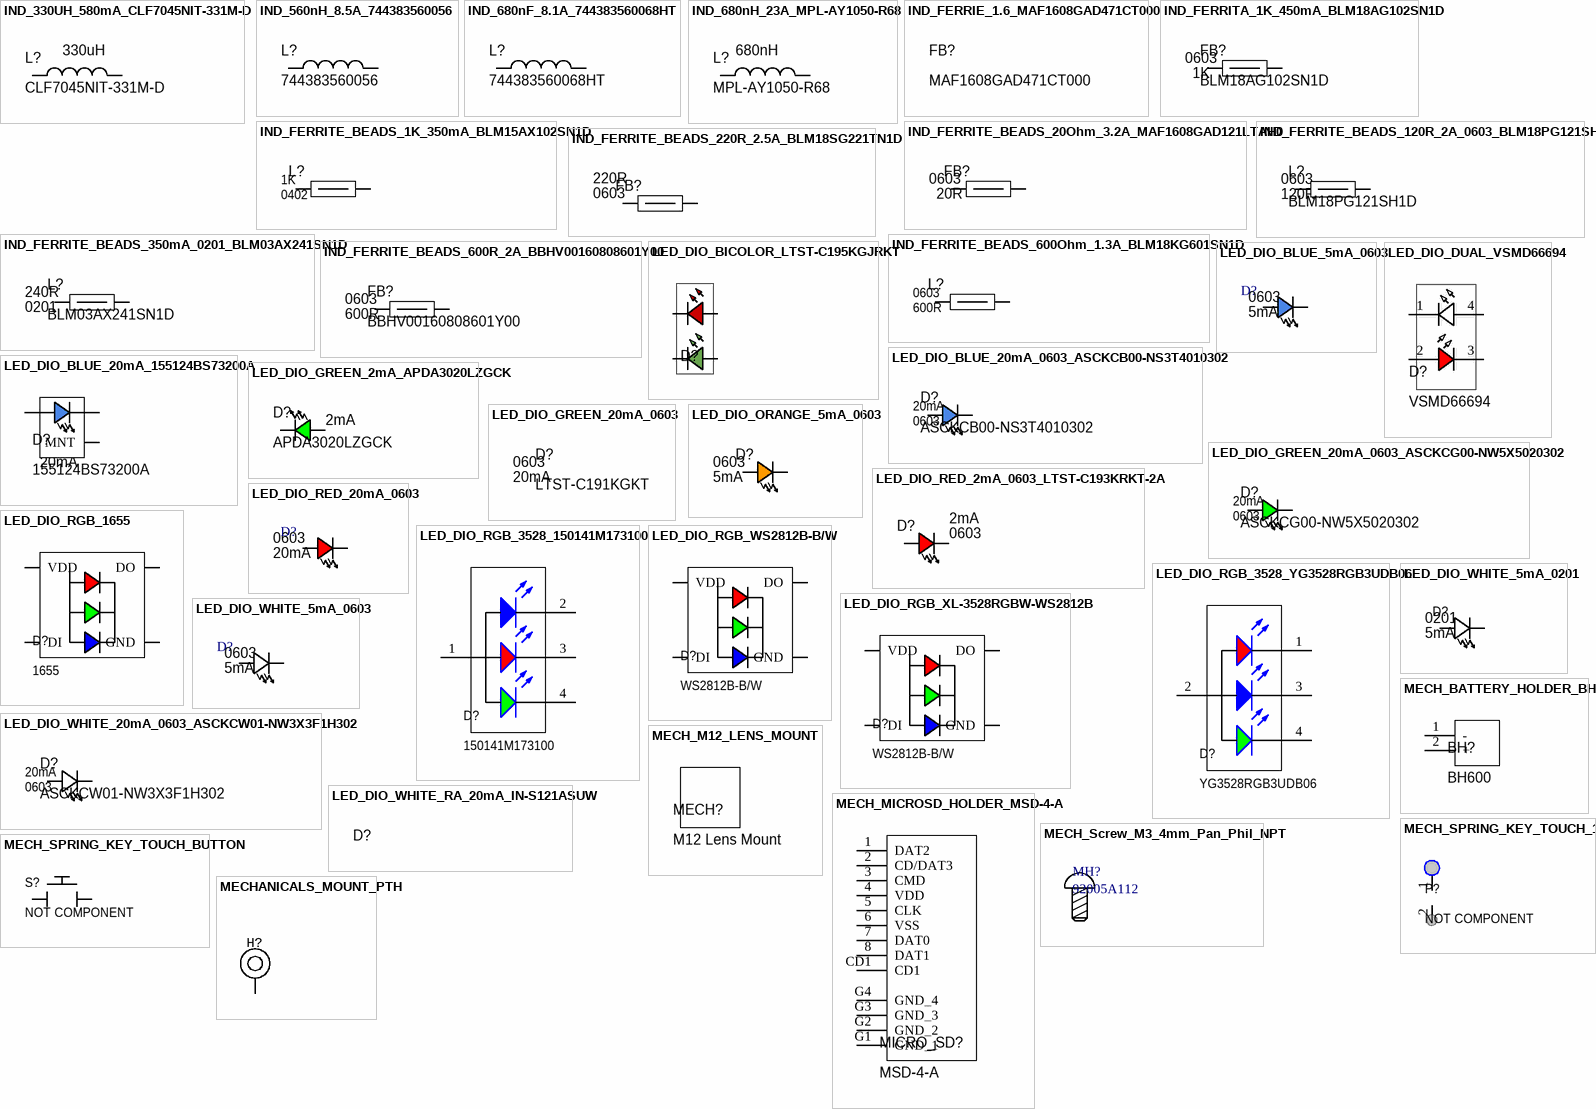
[diagram p30: symbols IND_330UH_580mA_CLF7045NIT-331M-D to MECHANICALS_MOUNT_PTH]

## IND_330UH_580mA_CLF7045NIT-331M-D
designator L?, comment CLF7045NIT-331M-D  Inductance: 330uH
Inductor Power Shielded Wirewound 330uH 20% 100KHz Ferrite 580mA 800mOhm DCR Automotive T/R; Manufacturer: TDK; Saturation Current: 500mA; DC Resistance (DCR): 960mR; Supplier 1: Mouser; Manufacturer Part Number: CLF7045NIT-331M-D; RoHS: Yes; Category: Fixed Inductors; Stock 1: 1471; Pricing 1: 1=1.04, 10=0.971, 50=0.971, 100=0.68, 1000=0.502, 10000=0.453 (USD); Mount: Surface Mount; Case/Package: Nonstandard; Core Material: Ferrite; Min Operating Temperature: -55°C; Max Operating Temperature: 150°C; Packaging: Cut Tape; Shielding: Shielded; Test Frequency: 100kHz; RMS Current (Irms): 580mA; Tolerance: 20%; Inductance Tolerance: 20%; Series: CLF-NI-D; Ratings: AEC-Q200; Reach SVHC Compliant: No; RoHS Compliant: Yes; ComponentLink1URL: https://product.tdk.com/info/en/catalog/datasheets/inductor_automotive_power_clf7045ni-d_en.pdf?ref_disty=digikey&src-supplier=Digi-Key; ComponentLink1Description: https://product.tdk.com/info/en/catalog/datasheets/inductor_automotive_power_clf7045ni-d_en.pdf?ref_disty=digikey&src-supplier=Digi-Key; ComponentLink2URL: https://product.tdk.com/info/en/catalog/datasheets/inductor_automotive_power_clf7045ni-d_en.pdf?src-supplier=Digi-Key; ComponentLink2Description: https://product.tdk.com/info/en/catalog/datasheets/inductor_automotive_power_clf7045ni-d_en.pdf?src-supplier=Digi-Key; ComponentLink3URL: https://datasheet.octopart.com/CLF7045NIT-331M-D-TDK-datasheet-67357126.pdf?src-supplier=Newark; ComponentLink3Description: https://datasheet.octopart.com/CLF7045NIT-331M-D-TDK-datasheet-67357126.pdf?src-supplier=Newark; Supplier Part Number 1: 810-CLF7045NIT331MD
footprint IND_CLF7045_* (0.291" L x 0.276" W (7.40mm x 7.00mm))
pins: 1, 2
